# Altium footprint library AOO.PcbLib: 131 footprints (part 3 of 9)
Each footprint in its own frame and in the unit in brackets; x right, y up, seen from the top. Pads: shape width x height; smd on the part's side, far side on the other; paste and mask are expansions set on the pad; w line width, h text height; cw(c..) or ccw(c..) is an arc to the next point about the centre after c.
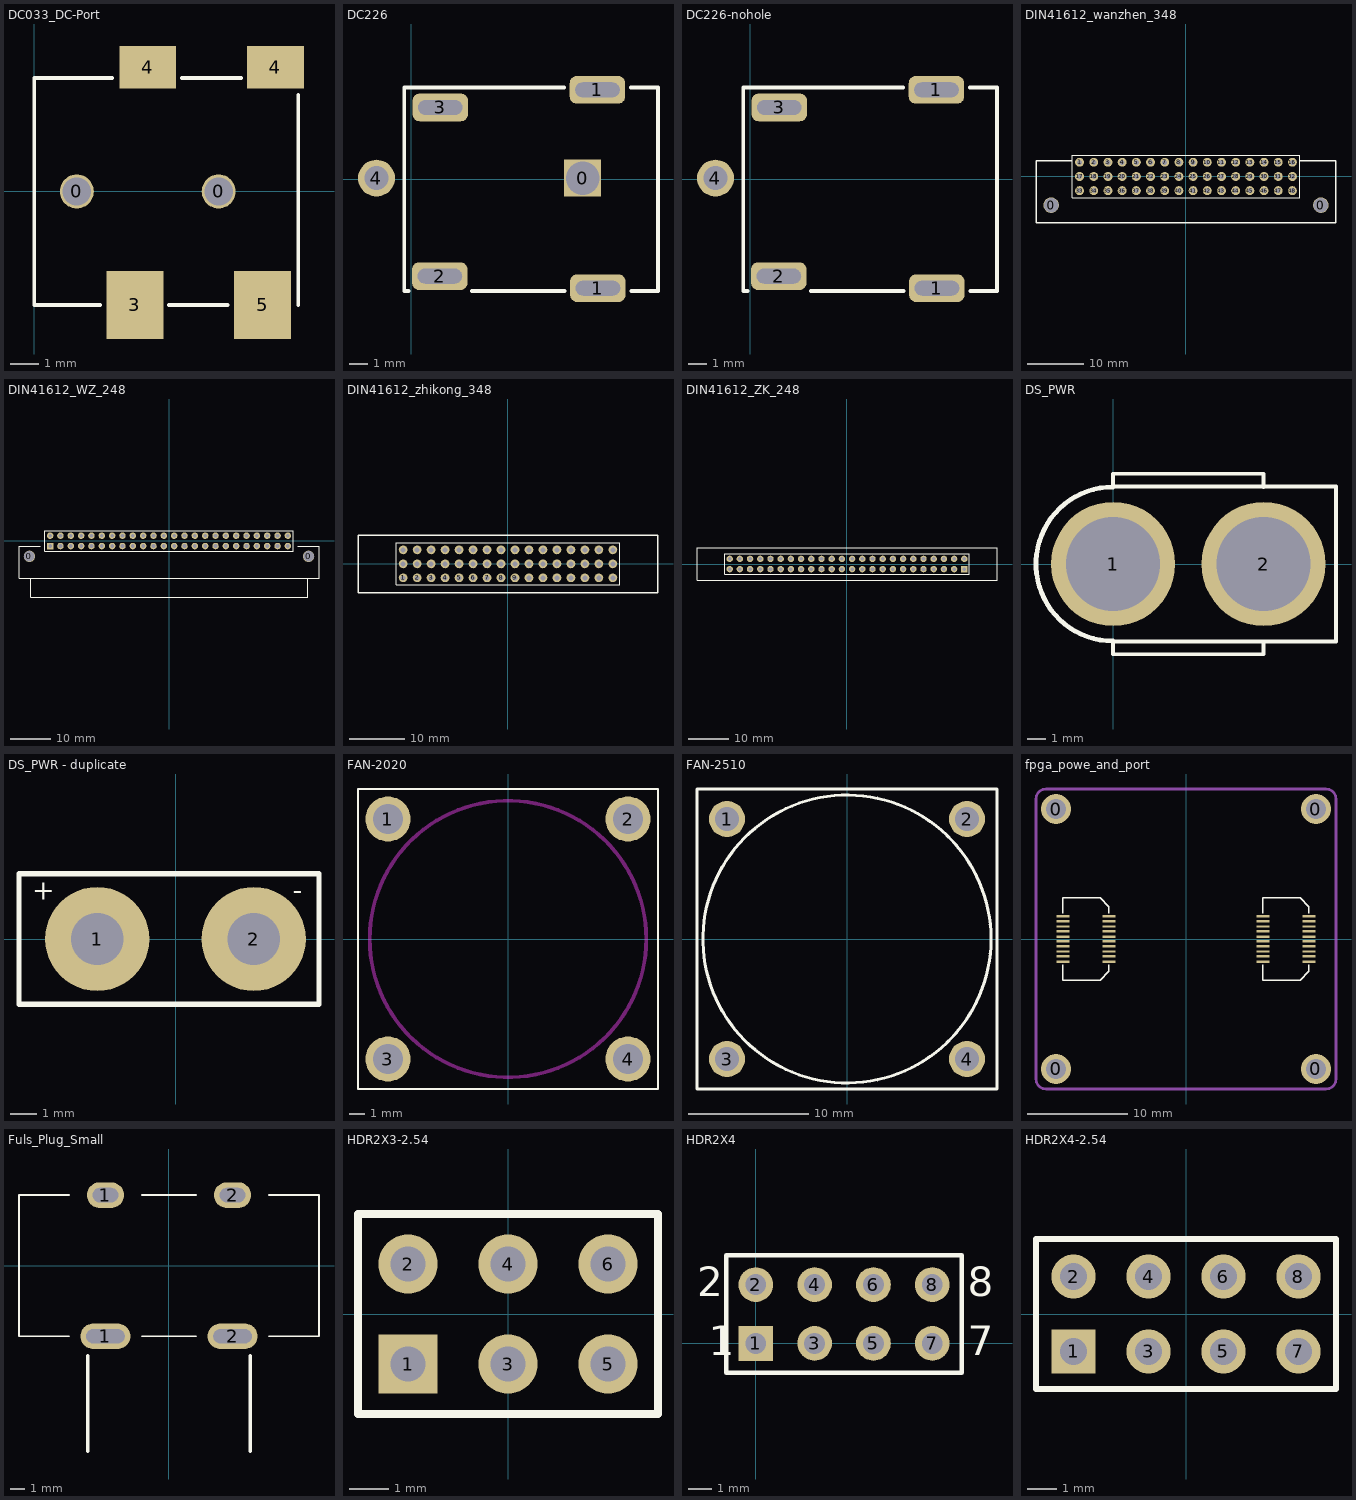
[diagram p2: the footprints below, top view; thin cyan lines are the x and y axes]

## DC033_DC-Port [mm] "DC033_DC-Port"
pads (6):
  round 1.2 hole 1: 0(1.5,0) 0(6.5,0)
  rect 2x2.4 smd: 3(3.55,-4) 5(8.05,-4)
  rect 2x1.5 smd: 4(4,4.375) 4(8.5,4.375)
Top Overlay:
  lines w0.127: 2.325,-4 0,-4 0,4 2.75,4 ; 4.75,-4 6.825,-4 ; 5.2,4 7.3,4 ; 9.31,-4 9.31,3.4
3D body: height 5.37, standoff -0.73, extent 0,-5 9.31,5

## DC226 [mm]
pads (6):
  rect 2x2 hole 1.8 square: 0(9.275,0.05)
  rrect50% 3x1.5 hole 0.8 slot 2.4 at 0 deg: 1(10.075,4.825) 1(10.1,-5.9) 2(1.55,-5.25) 3(1.575,3.875)
  round 2 hole 1.3: 4(-1.875,0.05)
Top Overlay:
  lines w0.203: -0.15,-6.05 -0.375,-6.05 -0.375,4.95 8.275,4.95 ; 3.275,-6.05 8.3,-6.05 ; 11.875,4.95 13.35,4.95 13.35,-6.05 11.9,-6.05
3D body: height 7.32, standoff -0.71, extent -2.4,-6.05 13.35,4.95

## DC226-nohole [mm]
pads (5):
  rrect50% 3x1.5 hole 0.8 slot 2.4 at 0 deg: 1(10.075,4.825) 1(10.1,-5.9) 2(1.55,-5.25) 3(1.575,3.875)
  round 2 hole 1.3: 4(-1.875,0.05)
Top Overlay:
  lines w0.203: -0.15,-6.05 -0.375,-6.05 -0.375,4.95 8.275,4.95 ; 3.275,-6.05 8.3,-6.05 ; 11.875,4.95 13.35,4.95 13.35,-6.05 11.9,-6.05
3D body: height 7.32, standoff -0.71, extent -2.4,-6.05 13.35,4.95

## DIN41612_wanzhen_348 [mm] "DIN41612连接器弯针2*24"
pads (50):
  round 2.8 hole 2.6: 0(-24.15,-5.125) 0(24.15,-5.125)
  round 1.6 hole 0.9: 1(-19.05,2.54) 2(-16.51,2.54) 3(-13.97,2.54) 4(-11.43,2.54) 5(-8.89,2.54) 6(-6.35,2.54) 7(-3.81,2.54) 8(-1.27,2.54) 9(1.27,2.54) 10(3.81,2.54) 11(6.35,2.54) 12(8.89,2.54) 13(11.43,2.54) 14(13.97,2.54) 15(16.51,2.54) 16(19.05,2.54) 17(-19.05,0) 18(-16.51,0) 19(-13.97,0) 20(-11.43,0) 21(-8.89,0) 22(-6.35,0) 23(-3.81,0) 24(-1.27,0) 25(1.27,0) 26(3.81,0) 27(6.35,0) 28(8.89,0) 29(11.43,0) 30(13.97,0) 31(16.51,0) 32(19.05,0) 33(-19.05,-2.54) 34(-16.51,-2.54) 35(-13.97,-2.54) 36(-11.43,-2.54) 37(-8.89,-2.54) 38(-6.35,-2.54) 39(-3.81,-2.54) 40(-1.27,-2.54) 41(1.27,-2.54) 42(3.81,-2.54) 43(6.35,-2.54) 44(8.89,-2.54) 45(11.43,-2.54) 46(13.97,-2.54) 47(16.51,-2.54) 48(19.05,-2.54)
Top Overlay:
  lines w0.2: -20.32,-3.81 20.32,-3.81 20.32,3.81 -20.32,3.81 -20.32,-3.81
  lines w0.254: -20.35,2.8 -26.85,2.8 -26.85,-8.3 26.85,-8.3 26.85,2.825 20.32,2.825
Bottom Overlay:
  lines w0.2: -20.32,-3.81 -20.32,3.81 20.32,3.81 20.32,-3.81 -20.32,-3.81
3D body: height 9.42, standoff -2.62, extent -26.85,-15.22 26.85,2.8

## DIN41612_WZ_248 [mm] "DIN41612连接器弯针2*24"
pads (50):
  round 2.8 hole 2.6: 0(-34.3,-3.8) 0(34.3,-3.8)
  rect 1.6x1.6 hole 0.9: 1(-29.21,-1.27)
  round 1.6 hole 0.9: 2(-29.21,1.27) 3(-26.67,-1.27) 4(-26.67,1.27) 5(-24.13,-1.27) 6(-24.13,1.27) 7(-21.59,-1.27) 8(-21.59,1.27) 9(-19.05,-1.27) 10(-19.05,1.27) 11(-16.51,-1.27) 12(-16.51,1.27) 13(-13.97,-1.27) 14(-13.97,1.27) 15(-11.43,-1.27) 16(-11.43,1.27) 17(-8.89,-1.27) 18(-8.89,1.27) 19(-6.35,-1.27) 20(-6.35,1.27) 21(-3.81,-1.27) 22(-3.81,1.27) 23(-1.27,-1.27) 24(-1.27,1.27) 25(1.27,-1.27) 26(1.27,1.27) 27(3.81,-1.27) 28(3.81,1.27) 29(6.35,-1.27) 30(6.35,1.27) 31(8.89,-1.27) 32(8.89,1.27) 33(11.43,-1.27) 34(11.43,1.27) 35(13.97,-1.27) 36(13.97,1.27) 37(16.51,-1.27) 38(16.51,1.27) 39(19.05,-1.27) 40(19.05,1.27) 41(21.59,-1.27) 42(21.59,1.27) 43(24.13,-1.27) 44(24.13,1.27) 45(26.67,-1.27) 46(26.67,1.27) 47(29.21,-1.27) 48(29.21,1.27)
Top Overlay:
  lines w0.2: -30.48,-2.54 30.48,-2.54 30.48,2.54 -30.48,2.54 -30.48,-2.54
  lines w0.254: -34,-9.2 -34,-13.9 34.1,-13.9 34.1,-9.2 ; -31.625,-1.27 -36.86,-1.27 -36.86,-9.2 36.86,-9.2 36.86,-1.27 31.625,-1.27
Bottom Overlay:
  lines w0.2: -30.48,-2.54 -30.48,2.54 30.48,2.54 30.48,-2.54 -30.48,-2.54
3D body: height 7.27, standoff -2.98, extent -36.85,-13.9 36.85,1.58

## DIN41612_zhikong_348 [mm] "DIN41612_zhikong_348"
pads (48):
  round 1.6 hole 0.9: 1(-19.05,-2.54) 2(-16.51,-2.54) 3(-13.97,-2.54) 4(-11.43,-2.54) 5(-8.89,-2.54) 6(-6.35,-2.54) 7(-3.81,-2.54) 8(-1.27,-2.54) 9(1.27,-2.54) 10(3.81,-2.54) 11(6.35,-2.54) 12(8.89,-2.54) 13(11.43,-2.54) 14(13.97,-2.54) 15(16.51,-2.54) 16(19.05,-2.54) 17(-19.05,0) 18(-16.51,0) 19(-13.97,0) 20(-11.43,0) 21(-8.89,0) 22(-6.35,0) 23(-3.81,0) 24(-1.27,0) 25(1.27,0) 26(3.81,0) 27(6.35,0) 28(8.89,0) 29(11.43,0) 30(13.97,0) 31(16.51,0) 32(19.05,0) 33(-19.05,2.54) 34(-16.51,2.54) 35(-13.97,2.54) 36(-11.43,2.54) 37(-8.89,2.54) 38(-6.35,2.54) 39(-3.81,2.54) 40(-1.27,2.54) 41(1.27,2.54) 42(3.81,2.54) 43(6.35,2.54) 44(8.89,2.54) 45(11.43,2.54) 46(13.97,2.54) 47(16.51,2.54) 48(19.05,2.54)
Top Overlay:
  lines w0.2: -20.32,-3.81 -20.32,3.81 20.32,3.81 20.32,-3.81 -20.32,-3.81
  lines w0.254: -27.25,-5.25 -27.25,5.2 27.25,5.2 27.25,-5.25 -27.25,-5.25
Bottom Overlay:
  lines w0.2: -20.32,-3.81 20.32,-3.81 20.32,3.81 -20.32,3.81 -20.32,-3.81
3D body: height 11.72, standoff -3.98, extent -27.25,-5.25 27.25,5.25

## DIN41612_ZK_248 [mm] "DIN41612连接器直孔2*24"
pads (48):
  rect 1.6x1.6 hole 0.9: 1(29.21,-1.27)
  round 1.6 hole 0.9: 2(29.21,1.27) 3(26.67,-1.27) 4(26.67,1.27) 5(24.13,-1.27) 6(24.13,1.27) 7(21.59,-1.27) 8(21.59,1.27) 9(19.05,-1.27) 10(19.05,1.27) 11(16.51,-1.27) 12(16.51,1.27) 13(13.97,-1.27) 14(13.97,1.27) 15(11.43,-1.27) 16(11.43,1.27) 17(8.89,-1.27) 18(8.89,1.27) 19(6.35,-1.27) 20(6.35,1.27) 21(3.81,-1.27) 22(3.81,1.27) 23(1.27,-1.27) 24(1.27,1.27) 25(-1.27,-1.27) 26(-1.27,1.27) 27(-3.81,-1.27) 28(-3.81,1.27) 29(-6.35,-1.27) 30(-6.35,1.27) 31(-8.89,-1.27) 32(-8.89,1.27) 33(-11.43,-1.27) 34(-11.43,1.27) 35(-13.97,-1.27) 36(-13.97,1.27) 37(-16.51,-1.27) 38(-16.51,1.27) 39(-19.05,-1.27) 40(-19.05,1.27) 41(-21.59,-1.27) 42(-21.59,1.27) 43(-24.13,-1.27) 44(-24.13,1.27) 45(-26.67,-1.27) 46(-26.67,1.27) 47(-29.21,-1.27) 48(-29.21,1.27)
Top Overlay:
  lines w0.2: -30.48,-2.54 -30.48,2.54 30.48,2.54 30.48,-2.54 -30.48,-2.54
  lines w0.254: -37.34,-4 -37.34,4 37.34,4 37.34,-4 -37.34,-4
Bottom Overlay:
  lines w0.2: -30.48,-2.54 30.48,-2.54 30.48,2.54 -30.48,2.54 -30.48,-2.54
3D body: height 11.62, standoff -3.98, extent -37.34,-4 37.34,4

## DS_PWR [mm]
pads (2):
  round 6.6 hole 5: 1(0,0) 2(8,0)
Top Overlay:
  lines w0.2: -0.025,4.125 11.85,4.125 11.85,-4.125 0,-4.125 ; 0,-4.15 0,-4.8 8,-4.8 8,-4.175 ; 0,4.1 0,4.8 8,4.8 8,4.1
  lines w0.254: 0,-4.1 cw(c0,0) 0,4.1
3D body: height 15.5, standoff -5.5, extent -3.95,-3.775 11.55,3.725

## DS_PWR - duplicate [mm]
pads (2):
  round 4 hole 2: 1(-3,0) 2(3,0)
Top Overlay:
  lines w0.2: -6,-2.5 5.5,-2.5 5.5,2.5 -6,2.5 -6,-2.5
  text "+" at -5.5,1.5 h0.76
  text "-" at 4.5,1.5 h0.76

## FAN-2020 [mm] "4012_Littelfuse_463_series"
pads (4):
  round 3 hole 2: 1(-8,8) 2(8,8) 3(-8,-8) 4(8,-8)
Top Overlay:
  lines w0.127: -10,-10 10,-10 10,10 -10,10 -10,-10
Keep-Out Layer:
  circle w0.254: c0,0 r9.22
3D body: height 10.02, standoff 0.02, extent -10,-10 10,10

## FAN-2510 [mm] "4012_Littelfuse_463_series"
pads (4):
  round 3 hole 2: 1(-10,10) 2(10,10) 3(-10,-10) 4(10,-10)
Top Overlay:
  circle w0.254: c0,0 r12
  lines w0.254: -12.5,-12.5 12.5,-12.5 12.5,12.5 -12.5,12.5 -12.5,-12.5
3D body: height 10.02, standoff 0.02, extent -12.5,-12.5 12.5,12.5

## fpga_powe_and_port [mm]
pads (44):
  round 3 hole 2: 0(-13,-13) 0(-13,13) 0(13,-13) 0(13,13)
  rect 1.3x0.25 smd: 1(-12.3,2.25) 2(-7.7,2.25) 3(-12.3,1.75) 4(-7.7,1.75) 5(-12.3,1.25) 6(-7.7,1.25) 7(-12.3,0.75) 8(-7.7,0.75) 9(-12.3,0.25) 10(-7.7,0.25) 11(-12.3,-0.25) 12(-7.7,-0.25) 13(-12.3,-0.75) 14(-7.7,-0.75) 15(-12.3,-1.25) 16(-7.7,-1.25) 17(-12.3,-1.75) 18(-7.7,-1.75) 19(-12.3,-2.25) 20(-7.7,-2.25) 21(7.7,2.25) 22(12.3,2.25) 23(7.7,1.75) 24(12.3,1.75) 25(7.7,1.25) 26(12.3,1.25) 27(7.7,0.75) 28(12.3,0.75) 29(7.7,0.25) 30(12.3,0.25) 31(7.7,-0.25) 32(12.3,-0.25) 33(7.7,-0.75) 34(12.3,-0.75) 35(7.7,-1.25) 36(12.3,-1.25) 37(7.7,-1.75) 38(12.3,-1.75) 39(7.7,-2.25) 40(12.3,-2.25)
Top Overlay:
  lines w0.127: -12.3,-2.6 -12.3,-4.1 -8.55,-4.1 -7.7,-3.25 -7.7,-2.6 ; -12.3,2.6 -12.3,4.1 -8.55,4.1 -7.7,3.25 -7.7,2.6 ; 7.7,-2.6 7.7,-4.1 11.45,-4.1 12.3,-3.25 12.3,-2.6 ; 7.7,2.6 7.7,4.1 11.45,4.1 12.3,3.25 12.3,2.6
Mechanical 2:
  lines w0.254: -15,-14 ccw(c-14,-14) -14,-15 14,-15 ccw(c14,-14) 15,-14 15,14 ccw(c14,14) 14,15 -14,15 ccw(c-14,14) -15,14 -15,-14
3D body: height 3.02, standoff -0.02, extent -12.7,-4.1 -7.3,4.1
3D body: height 3.02, standoff -0.02, extent 7.3,-4.1 12.699,4.1
3D body: height 9.02, standoff 0.66, extent -15.009,-15 15.009,15.034

## Fuls_Plug_Small [mm] "TBU_P500-G120"
pads (4):
  oval 3.5x1.8 hole 1 slot 2.7 at 0 deg: 1(-4.45,-4.94) 2(4.45,-4.94)
  oval 2.6x1.8 hole 1 slot 1.8 at 0 deg: 1(-4.45,4.94) 2(4.45,4.94)
Top Overlay:
  lines w0.127: -7,-4.94 -10.5,-4.94 -10.5,4.94 -7,4.94 ; -1.9,-4.94 1.9,-4.94 ; -1.9,4.94 1.9,4.94 ; 7,-4.94 10.5,-4.94 10.5,4.94 7,4.94
  lines w0.254: -5.7,-13 -5.7,-6.3 ; 5.7,-13 5.7,-6.3
3D body: height 6.31, standoff -3.89, extent -10.5,-15.09 10.5,5.24

## HDR2X3-2.54 [mm] "Connector; Header; 20x2 Position"
pads (6):
  rect 1.5x1.5 hole 0.9: 1(-2.54,-1.27)
  round 1.5 hole 0.9: 2(-2.54,1.27) 3(0,-1.27) 4(0,1.27) 5(2.54,-1.27) 6(2.54,1.27)
Top Overlay:
  lines w0.2: -3.81,-2.54 3.81,-2.54 3.81,2.54 -3.81,2.54 -3.81,-2.54

## HDR2X4 [mm] "Connector; Header; 4x2 Position"
pads (8):
  rect 1.5x1.5 hole 0.9: 1(0,0)
  round 1.5 hole 0.9: 2(0,2.54) 3(2.54,0) 4(2.54,2.54) 5(5.08,0) 6(5.08,2.54) 7(7.62,0) 8(7.62,2.54)
Top Overlay:
  lines w0.2: -1.27,-1.27 -1.27,3.81 8.89,3.81 8.89,-1.27 -1.27,-1.27
  text "8" at 9.144,2.032 h1.27
  text "7" at 9.144,-0.508 h1.27
  text "1" at -2.032,-0.508 h1.27
  text "2" at -2.54,2.032 h1.27

## HDR2X4-2.54 [mm] "Connector; Header; 20x2 Position"
pads (8):
  rect 1.5x1.5 hole 0.9: 1(-3.81,-1.27)
  round 1.5 hole 0.9: 2(-3.81,1.27) 3(-1.27,-1.27) 4(-1.27,1.27) 5(1.27,-1.27) 6(1.27,1.27) 7(3.81,-1.27) 8(3.81,1.27)
Top Overlay:
  lines w0.2: -5.08,-2.54 5.08,-2.54 5.08,2.54 -5.08,2.54 -5.08,-2.54